# Altium schematic symbol library jlcpcb_2025_04_capacitors_extended_0805.schlib: 3281 symbols (part 8 of 18) (continued)
## CC0805GRNPO0BN221
designator C?  Capacitance: 220pF  (hidden comment: *)
Capacitor, Ceramic (MLCC), 220pF, ±2%, 100V, NP0, ±2%, SMD 0805; Manufacturer: YAGEO; Manufacturer Part Number: CC0805GRNPO0BN221; Package Size: 0805; JLCPCB Basic Part: No; JLCPCB Part Number: C576920; Supplier 1: LCSC; Category: Capacitors - MLCC; Supplier Part Number 1: C576920; Tolerance: ±2%; Voltage Rating: 100V; Temperature Coefficient: NP0; RoHS: Yes; ComponentLink1Description: Datasheet; ComponentLink1URL: https://wmsc.lcsc.com/wmsc/upload/file/pdf/v2/lcsc/2311211121_YAGEO-CC0805GRNPO0BN221_C576920.pdf; ComponentLink2Description: JLCPCB Part URL; ComponentLink2URL: https://jlcpcb.com/partdetail/C576920; ComponentLink3Description: LCSC Part URL; ComponentLink3URL: https://lcsc.com/product-detail/Multilayer-Ceramic-Capacitors-MLCC---SMD-SMT_YAGEO-YAGEO-CC0805GRNPO0BN221_C576920.html
footprint CAP-0805 (0805 (2012M) Capacitor)
pins: 1, 2

## CC0805GRNPO0BN331
designator C?  Capacitance: 330pF  (hidden comment: *)
Capacitor, Ceramic (MLCC), 330pF, ±2%, 100V, NP0, ±2%, SMD 0805; Manufacturer: YAGEO; Manufacturer Part Number: CC0805GRNPO0BN331; Package Size: 0805; JLCPCB Basic Part: No; JLCPCB Part Number: C527193; Supplier 1: LCSC; Category: Capacitors - MLCC; Supplier Part Number 1: C527193; Tolerance: ±2%; Voltage Rating: 100V; Temperature Coefficient: NP0; RoHS: Yes; ComponentLink1Description: Datasheet; ComponentLink1URL: https://wmsc.lcsc.com/wmsc/upload/file/pdf/v2/lcsc/2007021836_YAGEO-CC0805GRNPO0BN331_C527193.pdf; ComponentLink2Description: JLCPCB Part URL; ComponentLink2URL: https://jlcpcb.com/partdetail/C527193; ComponentLink3Description: LCSC Part URL; ComponentLink3URL: https://lcsc.com/product-detail/Multilayer-Ceramic-Capacitors-MLCC---SMD-SMT_YAGEO-YAGEO-CC0805GRNPO0BN331_C527193.html
footprint CAP-0805 (0805 (2012M) Capacitor)
pins: 1, 2

## CC0805GRNPO0BN391
designator C?  Capacitance: 390pF  (hidden comment: *)
Capacitor, Ceramic (MLCC), 390pF, ±2%, 100V, NP0, ±2%, SMD 0805; Manufacturer: YAGEO; Manufacturer Part Number: CC0805GRNPO0BN391; Package Size: 0805; JLCPCB Basic Part: No; JLCPCB Part Number: C1853349; Supplier 1: LCSC; Category: Capacitors - MLCC; Supplier Part Number 1: C1853349; Tolerance: ±2%; Voltage Rating: 100V; Temperature Coefficient: NP0; RoHS: Yes; ComponentLink1Description: Datasheet; ComponentLink1URL: https://wmsc.lcsc.com/wmsc/upload/file/pdf/v2/lcsc/2201271030_YAGEO-CC0805GRNPO0BN391_C1853349.pdf; ComponentLink2Description: JLCPCB Part URL; ComponentLink2URL: https://jlcpcb.com/partdetail/C1853349; ComponentLink3Description: LCSC Part URL; ComponentLink3URL: https://lcsc.com/product-detail/Multilayer-Ceramic-Capacitors-MLCC---SMD-SMT_YAGEO-YAGEO-CC0805GRNPO0BN391_C1853349.html
footprint CAP-0805 (0805 (2012M) Capacitor)
pins: 1, 2

## CC0805GRNPO0BN470
designator C?  Capacitance: 47pF  (hidden comment: *)
Capacitor, Ceramic (MLCC), 47pF, ±2%, 100V, NP0, ±2%, SMD 0805; Manufacturer: YAGEO; Manufacturer Part Number: CC0805GRNPO0BN470; Package Size: 0805; JLCPCB Basic Part: No; JLCPCB Part Number: C527195; Supplier 1: LCSC; Category: Capacitors - MLCC; Supplier Part Number 1: C527195; Tolerance: ±2%; Voltage Rating: 100V; Temperature Coefficient: NP0; RoHS: Yes; ComponentLink1Description: Datasheet; ComponentLink1URL: https://wmsc.lcsc.com/wmsc/upload/file/pdf/v2/lcsc/2007091834_YAGEO-CC0805GRNPO0BN470_C527195.pdf; ComponentLink2Description: JLCPCB Part URL; ComponentLink2URL: https://jlcpcb.com/partdetail/C527195; ComponentLink3Description: LCSC Part URL; ComponentLink3URL: https://lcsc.com/product-detail/Multilayer-Ceramic-Capacitors-MLCC---SMD-SMT_YAGEO-YAGEO-CC0805GRNPO0BN470_C527195.html
footprint CAP-0805 (0805 (2012M) Capacitor)
pins: 1, 2

## CC0805GRNPO0BN471
designator C?  Capacitance: 470pF  (hidden comment: *)
Capacitor, Ceramic (MLCC), 470pF, ±2%, 100V, NP0, ±2%, SMD 0805; Manufacturer: YAGEO; Manufacturer Part Number: CC0805GRNPO0BN471; Package Size: 0805; JLCPCB Basic Part: No; JLCPCB Part Number: C527196; Supplier 1: LCSC; Category: Capacitors - MLCC; Supplier Part Number 1: C527196; Tolerance: ±2%; Voltage Rating: 100V; Temperature Coefficient: NP0; RoHS: Yes; ComponentLink1Description: Datasheet; ComponentLink1URL: https://wmsc.lcsc.com/wmsc/upload/file/pdf/v2/lcsc/2006241834_YAGEO-CC0805GRNPO0BN471_C527196.pdf; ComponentLink2Description: JLCPCB Part URL; ComponentLink2URL: https://jlcpcb.com/partdetail/C527196; ComponentLink3Description: LCSC Part URL; ComponentLink3URL: https://lcsc.com/product-detail/Multilayer-Ceramic-Capacitors-MLCC---SMD-SMT_YAGEO-YAGEO-CC0805GRNPO0BN471_C527196.html
footprint CAP-0805 (0805 (2012M) Capacitor)
pins: 1, 2

## CC0805GRNPO0BN561
designator C?  Capacitance: 560pF  (hidden comment: *)
Capacitor, Ceramic (MLCC), 560pF, ±2%, 100V, NP0, ±2%, SMD 0805; Manufacturer: YAGEO; Manufacturer Part Number: CC0805GRNPO0BN561; Package Size: 0805; JLCPCB Basic Part: No; JLCPCB Part Number: C527197; Supplier 1: LCSC; Category: Capacitors - MLCC; Supplier Part Number 1: C527197; Tolerance: ±2%; Voltage Rating: 100V; Temperature Coefficient: NP0; RoHS: Yes; ComponentLink1Description: Datasheet; ComponentLink1URL: https://wmsc.lcsc.com/wmsc/upload/file/pdf/v2/lcsc/2007021836_YAGEO-CC0805GRNPO0BN561_C527197.pdf; ComponentLink2Description: JLCPCB Part URL; ComponentLink2URL: https://jlcpcb.com/partdetail/C527197; ComponentLink3Description: LCSC Part URL; ComponentLink3URL: https://lcsc.com/product-detail/Multilayer-Ceramic-Capacitors-MLCC---SMD-SMT_YAGEO-YAGEO-CC0805GRNPO0BN561_C527197.html
footprint CAP-0805 (0805 (2012M) Capacitor)
pins: 1, 2

## CC0805GRNPO0BN680
designator C?  Capacitance: 68pF  (hidden comment: *)
Capacitor, Ceramic (MLCC), 68pF, ±2%, 100V, NP0, ±2%, SMD 0805; Manufacturer: YAGEO; Manufacturer Part Number: CC0805GRNPO0BN680; Package Size: 0805; JLCPCB Basic Part: No; JLCPCB Part Number: C576925; Supplier 1: LCSC; Category: Capacitors - MLCC; Supplier Part Number 1: C576925; Tolerance: ±2%; Voltage Rating: 100V; Temperature Coefficient: NP0; RoHS: Yes; ComponentLink1Description: Datasheet; ComponentLink1URL: https://wmsc.lcsc.com/wmsc/upload/file/pdf/v2/lcsc/2311211121_YAGEO-CC0805GRNPO0BN680_C576925.pdf; ComponentLink2Description: JLCPCB Part URL; ComponentLink2URL: https://jlcpcb.com/partdetail/C576925; ComponentLink3Description: LCSC Part URL; ComponentLink3URL: https://lcsc.com/product-detail/Multilayer-Ceramic-Capacitors-MLCC---SMD-SMT_YAGEO-YAGEO-CC0805GRNPO0BN680_C576925.html
footprint CAP-0805 (0805 (2012M) Capacitor)
pins: 1, 2

## CC0805GRNPO0BN681
designator C?  Capacitance: 680pF  (hidden comment: *)
Capacitor, Ceramic (MLCC), 680pF, ±2%, 100V, NP0, ±2%, SMD 0805; Manufacturer: YAGEO; Manufacturer Part Number: CC0805GRNPO0BN681; Package Size: 0805; JLCPCB Basic Part: No; JLCPCB Part Number: C576926; Supplier 1: LCSC; Category: Capacitors - MLCC; Supplier Part Number 1: C576926; Tolerance: ±2%; Voltage Rating: 100V; Temperature Coefficient: NP0; RoHS: Yes; ComponentLink1Description: Datasheet; ComponentLink1URL: https://wmsc.lcsc.com/wmsc/upload/file/pdf/v2/lcsc/2212222108_YAGEO-CC0805GRNPO0BN681_C576926.pdf; ComponentLink2Description: JLCPCB Part URL; ComponentLink2URL: https://jlcpcb.com/partdetail/C576926; ComponentLink3Description: LCSC Part URL; ComponentLink3URL: https://lcsc.com/product-detail/Multilayer-Ceramic-Capacitors-MLCC---SMD-SMT_YAGEO-YAGEO-CC0805GRNPO0BN681_C576926.html
footprint CAP-0805 (0805 (2012M) Capacitor)
pins: 1, 2

## CC0805GRNPO9BN100
designator C?  Capacitance: 10pF  (hidden comment: *)
Capacitor, Ceramic (MLCC), 10pF, ±2%, 50V, NP0, ±2%, SMD 0805; Manufacturer: YAGEO; Manufacturer Part Number: CC0805GRNPO9BN100; Package Size: 0805; JLCPCB Basic Part: No; JLCPCB Part Number: C520053; Supplier 1: LCSC; Category: Capacitors - MLCC; Supplier Part Number 1: C520053; Tolerance: ±2%; Voltage Rating: 50V; Temperature Coefficient: NP0; RoHS: Yes; ComponentLink1Description: Datasheet; ComponentLink1URL: https://wmsc.lcsc.com/wmsc/upload/file/pdf/v2/lcsc/2008051835_YAGEO-CC0805GRNPO9BN100_C520053.pdf; ComponentLink2Description: JLCPCB Part URL; ComponentLink2URL: https://jlcpcb.com/partdetail/C520053; ComponentLink3Description: LCSC Part URL; ComponentLink3URL: https://lcsc.com/product-detail/Multilayer-Ceramic-Capacitors-MLCC---SMD-SMT_YAGEO-YAGEO-CC0805GRNPO9BN100_C520053.html
footprint CAP-0805 (0805 (2012M) Capacitor)
pins: 1, 2

## CC0805GRNPO9BN101
designator C?  Capacitance: 100pF  (hidden comment: *)
Capacitor, Ceramic (MLCC), 100pF, ±2%, 50V, NP0, ±2%, SMD 0805; Manufacturer: YAGEO; Manufacturer Part Number: CC0805GRNPO9BN101; Package Size: 0805; JLCPCB Basic Part: No; JLCPCB Part Number: C520054; Supplier 1: LCSC; Category: Capacitors - MLCC; Supplier Part Number 1: C520054; Tolerance: ±2%; Voltage Rating: 50V; Temperature Coefficient: NP0; RoHS: Yes; ComponentLink1Description: Datasheet; ComponentLink1URL: https://wmsc.lcsc.com/wmsc/upload/file/pdf/v2/lcsc/2008031234_YAGEO-CC0805GRNPO9BN101_C520054.pdf; ComponentLink2Description: JLCPCB Part URL; ComponentLink2URL: https://jlcpcb.com/partdetail/C520054; ComponentLink3Description: LCSC Part URL; ComponentLink3URL: https://lcsc.com/product-detail/Multilayer-Ceramic-Capacitors-MLCC---SMD-SMT_YAGEO-YAGEO-CC0805GRNPO9BN101_C520054.html
footprint CAP-0805 (0805 (2012M) Capacitor)
pins: 1, 2

## CC0805GRNPO9BN102
designator C?  Capacitance: 1nF  (hidden comment: *)
Capacitor, Ceramic (MLCC), 1nF, ±2%, 50V, NP0, ±2%, SMD 0805; Manufacturer: YAGEO; Manufacturer Part Number: CC0805GRNPO9BN102; Package Size: 0805; JLCPCB Basic Part: No; JLCPCB Part Number: C520093; Supplier 1: LCSC; Category: Capacitors - MLCC; Supplier Part Number 1: C520093; Tolerance: ±2%; Voltage Rating: 50V; Temperature Coefficient: NP0; RoHS: Yes; ComponentLink1Description: Datasheet; ComponentLink1URL: https://wmsc.lcsc.com/wmsc/upload/file/pdf/v2/lcsc/2007231535_YAGEO-CC0805GRNPO9BN102_C520093.pdf; ComponentLink2Description: JLCPCB Part URL; ComponentLink2URL: https://jlcpcb.com/partdetail/C520093; ComponentLink3Description: LCSC Part URL; ComponentLink3URL: https://lcsc.com/product-detail/Multilayer-Ceramic-Capacitors-MLCC---SMD-SMT_YAGEO-YAGEO-CC0805GRNPO9BN102_C520093.html
footprint CAP-0805 (0805 (2012M) Capacitor)
pins: 1, 2

## CC0805GRNPO9BN120
designator C?  Capacitance: 12pF  (hidden comment: *)
Capacitor, Ceramic (MLCC), 12pF, ±2%, 50V, NP0, ±2%, SMD 0805; Manufacturer: YAGEO; Manufacturer Part Number: CC0805GRNPO9BN120; Package Size: 0805; JLCPCB Basic Part: No; JLCPCB Part Number: C520055; Supplier 1: LCSC; Category: Capacitors - MLCC; Supplier Part Number 1: C520055; Tolerance: ±2%; Voltage Rating: 50V; Temperature Coefficient: NP0; RoHS: Yes; ComponentLink1Description: Datasheet; ComponentLink1URL: https://wmsc.lcsc.com/wmsc/upload/file/pdf/v2/lcsc/2007231535_YAGEO-CC0805GRNPO9BN120_C520055.pdf; ComponentLink2Description: JLCPCB Part URL; ComponentLink2URL: https://jlcpcb.com/partdetail/C520055; ComponentLink3Description: LCSC Part URL; ComponentLink3URL: https://lcsc.com/product-detail/Multilayer-Ceramic-Capacitors-MLCC---SMD-SMT_YAGEO-YAGEO-CC0805GRNPO9BN120_C520055.html
footprint CAP-0805 (0805 (2012M) Capacitor)
pins: 1, 2

## CC0805GRNPO9BN121
designator C?  Capacitance: 120pF  (hidden comment: *)
Capacitor, Ceramic (MLCC), 120pF, ±2%, 50V, NP0, ±2%, SMD 0805; Manufacturer: YAGEO; Manufacturer Part Number: CC0805GRNPO9BN121; Package Size: 0805; JLCPCB Basic Part: No; JLCPCB Part Number: C309483; Supplier 1: LCSC; Category: Capacitors - MLCC; Supplier Part Number 1: C309483; Tolerance: ±2%; Voltage Rating: 50V; Temperature Coefficient: NP0; RoHS: Yes; ComponentLink1Description: Datasheet; ComponentLink1URL: https://wmsc.lcsc.com/wmsc/upload/file/pdf/v2/lcsc/2304140030_YAGEO-CC0805GRNPO9BN121_C309483.pdf; ComponentLink2Description: JLCPCB Part URL; ComponentLink2URL: https://jlcpcb.com/partdetail/C309483; ComponentLink3Description: LCSC Part URL; ComponentLink3URL: https://lcsc.com/product-detail/Multilayer-Ceramic-Capacitors-MLCC---SMD-SMT_YAGEO-YAGEO-CC0805GRNPO9BN121_C309483.html
footprint CAP-0805 (0805 (2012M) Capacitor)
pins: 1, 2

## CC0805GRNPO9BN122
designator C?  Capacitance: 1.2nF  (hidden comment: *)
Capacitor, Ceramic (MLCC), 1.2nF, ±2%, 50V, NP0, ±2%, SMD 0805; Manufacturer: YAGEO; Manufacturer Part Number: CC0805GRNPO9BN122; Package Size: 0805; JLCPCB Basic Part: No; JLCPCB Part Number: C541552; Supplier 1: LCSC; Category: Capacitors - MLCC; Supplier Part Number 1: C541552; Tolerance: ±2%; Voltage Rating: 50V; Temperature Coefficient: NP0; RoHS: Yes; ComponentLink1Description: Datasheet; ComponentLink1URL: https://wmsc.lcsc.com/wmsc/upload/file/pdf/v2/lcsc/2006151144_YAGEO-CC0805GRNPO9BN122_C541552.pdf; ComponentLink2Description: JLCPCB Part URL; ComponentLink2URL: https://jlcpcb.com/partdetail/C541552; ComponentLink3Description: LCSC Part URL; ComponentLink3URL: https://lcsc.com/product-detail/Multilayer-Ceramic-Capacitors-MLCC---SMD-SMT_YAGEO-YAGEO-CC0805GRNPO9BN122_C541552.html
footprint CAP-0805 (0805 (2012M) Capacitor)
pins: 1, 2

## CC0805GRNPO9BN150
designator C?  Capacitance: 15pF  (hidden comment: *)
Capacitor, Ceramic (MLCC), 15pF, ±2%, 50V, NP0, ±2%, SMD 0805; Manufacturer: YAGEO; Manufacturer Part Number: CC0805GRNPO9BN150; Package Size: 0805; JLCPCB Basic Part: No; JLCPCB Part Number: C520056; Supplier 1: LCSC; Category: Capacitors - MLCC; Supplier Part Number 1: C520056; Tolerance: ±2%; Voltage Rating: 50V; Temperature Coefficient: NP0; RoHS: Yes; ComponentLink1Description: Datasheet; ComponentLink1URL: https://wmsc.lcsc.com/wmsc/upload/file/pdf/v2/lcsc/2008191833_YAGEO-CC0805GRNPO9BN150_C520056.pdf; ComponentLink2Description: JLCPCB Part URL; ComponentLink2URL: https://jlcpcb.com/partdetail/C520056; ComponentLink3Description: LCSC Part URL; ComponentLink3URL: https://lcsc.com/product-detail/Multilayer-Ceramic-Capacitors-MLCC---SMD-SMT_YAGEO-YAGEO-CC0805GRNPO9BN150_C520056.html
footprint CAP-0805 (0805 (2012M) Capacitor)
pins: 1, 2

## CC0805GRNPO9BN151
designator C?  Capacitance: 150pF  (hidden comment: *)
Capacitor, Ceramic (MLCC), 150pF, ±2%, 50V, NP0, ±2%, SMD 0805; Manufacturer: YAGEO; Manufacturer Part Number: CC0805GRNPO9BN151; Package Size: 0805; JLCPCB Basic Part: No; JLCPCB Part Number: C520084; Supplier 1: LCSC; Category: Capacitors - MLCC; Supplier Part Number 1: C520084; Tolerance: ±2%; Voltage Rating: 50V; Temperature Coefficient: NP0; RoHS: Yes; ComponentLink1Description: Datasheet; ComponentLink1URL: https://wmsc.lcsc.com/wmsc/upload/file/pdf/v2/lcsc/2006011837_YAGEO-CC0805GRNPO9BN151_C520084.pdf; ComponentLink2Description: JLCPCB Part URL; ComponentLink2URL: https://jlcpcb.com/partdetail/C520084; ComponentLink3Description: LCSC Part URL; ComponentLink3URL: https://lcsc.com/product-detail/Multilayer-Ceramic-Capacitors-MLCC---SMD-SMT_YAGEO-YAGEO-CC0805GRNPO9BN151_C520084.html
footprint CAP-0805 (0805 (2012M) Capacitor)
pins: 1, 2

## CC0805GRNPO9BN152
designator C?  Capacitance: 1.5nF  (hidden comment: *)
Capacitor, Ceramic (MLCC), 1.5nF, ±2%, 50V, NP0, ±2%, SMD 0805; Manufacturer: YAGEO; Manufacturer Part Number: CC0805GRNPO9BN152; Package Size: 0805; JLCPCB Basic Part: No; JLCPCB Part Number: C541553; Supplier 1: LCSC; Category: Capacitors - MLCC; Supplier Part Number 1: C541553; Tolerance: ±2%; Voltage Rating: 50V; Temperature Coefficient: NP0; RoHS: Yes; ComponentLink1Description: Datasheet; ComponentLink1URL: https://wmsc.lcsc.com/wmsc/upload/file/pdf/v2/lcsc/2006151145_YAGEO-CC0805GRNPO9BN152_C541553.pdf; ComponentLink2Description: JLCPCB Part URL; ComponentLink2URL: https://jlcpcb.com/partdetail/C541553; ComponentLink3Description: LCSC Part URL; ComponentLink3URL: https://lcsc.com/product-detail/Multilayer-Ceramic-Capacitors-MLCC---SMD-SMT_YAGEO-YAGEO-CC0805GRNPO9BN152_C541553.html
footprint CAP-0805 (0805 (2012M) Capacitor)
pins: 1, 2

## CC0805GRNPO9BN180
designator C?  Capacitance: 18pF  (hidden comment: *)
Capacitor, Ceramic (MLCC), 18pF, ±2%, 50V, NP0, ±2%, SMD 0805; Manufacturer: YAGEO; Manufacturer Part Number: CC0805GRNPO9BN180; Package Size: 0805; JLCPCB Basic Part: No; JLCPCB Part Number: C520057; Supplier 1: LCSC; Category: Capacitors - MLCC; Supplier Part Number 1: C520057; Tolerance: ±2%; Voltage Rating: 50V; Temperature Coefficient: NP0; RoHS: Yes; ComponentLink1Description: Datasheet; ComponentLink1URL: https://wmsc.lcsc.com/wmsc/upload/file/pdf/v2/lcsc/2007231535_YAGEO-CC0805GRNPO9BN180_C520057.pdf; ComponentLink2Description: JLCPCB Part URL; ComponentLink2URL: https://jlcpcb.com/partdetail/C520057; ComponentLink3Description: LCSC Part URL; ComponentLink3URL: https://lcsc.com/product-detail/Multilayer-Ceramic-Capacitors-MLCC---SMD-SMT_YAGEO-YAGEO-CC0805GRNPO9BN180_C520057.html
footprint CAP-0805 (0805 (2012M) Capacitor)
pins: 1, 2

## CC0805GRNPO9BN181
designator C?  Capacitance: 180pF  (hidden comment: *)
Capacitor, Ceramic (MLCC), 180pF, ±2%, 50V, NP0, ±2%, SMD 0805; Manufacturer: YAGEO; Manufacturer Part Number: CC0805GRNPO9BN181; Package Size: 0805; JLCPCB Basic Part: No; JLCPCB Part Number: C520085; Supplier 1: LCSC; Category: Capacitors - MLCC; Supplier Part Number 1: C520085; Tolerance: ±2%; Voltage Rating: 50V; Temperature Coefficient: NP0; RoHS: Yes; ComponentLink1Description: Datasheet; ComponentLink1URL: https://wmsc.lcsc.com/wmsc/upload/file/pdf/v2/lcsc/2006011837_YAGEO-CC0805GRNPO9BN181_C520085.pdf; ComponentLink2Description: JLCPCB Part URL; ComponentLink2URL: https://jlcpcb.com/partdetail/C520085; ComponentLink3Description: LCSC Part URL; ComponentLink3URL: https://lcsc.com/product-detail/Multilayer-Ceramic-Capacitors-MLCC---SMD-SMT_YAGEO-YAGEO-CC0805GRNPO9BN181_C520085.html
footprint CAP-0805 (0805 (2012M) Capacitor)
pins: 1, 2

## CC0805GRNPO9BN182
designator C?  Capacitance: 1.8nF  (hidden comment: *)
Capacitor, Ceramic (MLCC), 1.8nF, ±2%, 50V, NP0, ±2%, SMD 0805; Manufacturer: YAGEO; Manufacturer Part Number: CC0805GRNPO9BN182; Package Size: 0805; JLCPCB Basic Part: No; JLCPCB Part Number: C541554; Supplier 1: LCSC; Category: Capacitors - MLCC; Supplier Part Number 1: C541554; Tolerance: ±2%; Voltage Rating: 50V; Temperature Coefficient: NP0; RoHS: Yes; ComponentLink1Description: Datasheet; ComponentLink1URL: https://wmsc.lcsc.com/wmsc/upload/file/pdf/v2/lcsc/2006151145_YAGEO-CC0805GRNPO9BN182_C541554.pdf; ComponentLink2Description: JLCPCB Part URL; ComponentLink2URL: https://jlcpcb.com/partdetail/C541554; ComponentLink3Description: LCSC Part URL; ComponentLink3URL: https://lcsc.com/product-detail/Multilayer-Ceramic-Capacitors-MLCC---SMD-SMT_YAGEO-YAGEO-CC0805GRNPO9BN182_C541554.html
footprint CAP-0805 (0805 (2012M) Capacitor)
pins: 1, 2

## CC0805GRNPO9BN200
designator C?  Capacitance: 20pF  (hidden comment: *)
Capacitor, Ceramic (MLCC), 20pF, ±2%, 50V, NP0, ±2%, SMD 0805; Manufacturer: YAGEO; Manufacturer Part Number: CC0805GRNPO9BN200; Package Size: 0805; JLCPCB Basic Part: No; JLCPCB Part Number: C520066; Supplier 1: LCSC; Category: Capacitors - MLCC; Supplier Part Number 1: C520066; Tolerance: ±2%; Voltage Rating: 50V; Temperature Coefficient: NP0; RoHS: Yes; ComponentLink1Description: Datasheet; ComponentLink1URL: https://wmsc.lcsc.com/wmsc/upload/file/pdf/v2/lcsc/2007161235_YAGEO-CC0805GRNPO9BN200_C520066.pdf; ComponentLink2Description: JLCPCB Part URL; ComponentLink2URL: https://jlcpcb.com/partdetail/C520066; ComponentLink3Description: LCSC Part URL; ComponentLink3URL: https://lcsc.com/product-detail/Multilayer-Ceramic-Capacitors-MLCC---SMD-SMT_YAGEO-YAGEO-CC0805GRNPO9BN200_C520066.html
footprint CAP-0805 (0805 (2012M) Capacitor)
pins: 1, 2

## CC0805GRNPO9BN201
designator C?  Capacitance: 200pF  (hidden comment: *)
Capacitor, Ceramic (MLCC), 200pF, ±2%, 50V, NP0, ±2%, SMD 0805; Manufacturer: YAGEO; Manufacturer Part Number: CC0805GRNPO9BN201; Package Size: 0805; JLCPCB Basic Part: No; JLCPCB Part Number: C541504; Supplier 1: LCSC; Category: Capacitors - MLCC; Supplier Part Number 1: C541504; Tolerance: ±2%; Voltage Rating: 50V; Temperature Coefficient: NP0; RoHS: Yes; ComponentLink1Description: Datasheet; ComponentLink1URL: https://wmsc.lcsc.com/wmsc/upload/file/pdf/v2/lcsc/2006151141_YAGEO-CC0805GRNPO9BN201_C541504.pdf; ComponentLink2Description: JLCPCB Part URL; ComponentLink2URL: https://jlcpcb.com/partdetail/C541504; ComponentLink3Description: LCSC Part URL; ComponentLink3URL: https://lcsc.com/product-detail/Multilayer-Ceramic-Capacitors-MLCC---SMD-SMT_YAGEO-YAGEO-CC0805GRNPO9BN201_C541504.html
footprint CAP-0805 (0805 (2012M) Capacitor)
pins: 1, 2

## CC0805GRNPO9BN220
designator C?  Capacitance: 22pF  (hidden comment: *)
Capacitor, Ceramic (MLCC), 22pF, ±2%, 50V, NP0, ±2%, SMD 0805; Manufacturer: YAGEO; Manufacturer Part Number: CC0805GRNPO9BN220; Package Size: 0805; JLCPCB Basic Part: No; JLCPCB Part Number: C520058; Supplier 1: LCSC; Category: Capacitors - MLCC; Supplier Part Number 1: C520058; Tolerance: ±2%; Voltage Rating: 50V; Temperature Coefficient: NP0; RoHS: Yes; ComponentLink1Description: Datasheet; ComponentLink1URL: https://wmsc.lcsc.com/wmsc/upload/file/pdf/v2/lcsc/2006011836_YAGEO-CC0805GRNPO9BN220_C520058.pdf; ComponentLink2Description: JLCPCB Part URL; ComponentLink2URL: https://jlcpcb.com/partdetail/C520058; ComponentLink3Description: LCSC Part URL; ComponentLink3URL: https://lcsc.com/product-detail/Multilayer-Ceramic-Capacitors-MLCC---SMD-SMT_YAGEO-YAGEO-CC0805GRNPO9BN220_C520058.html
footprint CAP-0805 (0805 (2012M) Capacitor)
pins: 1, 2

## CC0805GRNPO9BN221
designator C?  Capacitance: 220pF  (hidden comment: *)
Capacitor, Ceramic (MLCC), 220pF, ±2%, 50V, NP0, ±2%, SMD 0805; Manufacturer: YAGEO; Manufacturer Part Number: CC0805GRNPO9BN221; Package Size: 0805; JLCPCB Basic Part: No; JLCPCB Part Number: C520086; Supplier 1: LCSC; Category: Capacitors - MLCC; Supplier Part Number 1: C520086; Tolerance: ±2%; Voltage Rating: 50V; Temperature Coefficient: NP0; RoHS: Yes; ComponentLink1Description: Datasheet; ComponentLink1URL: https://wmsc.lcsc.com/wmsc/upload/file/pdf/v2/lcsc/2005141204_YAGEO-CC0805GRNPO9BN221_C520086.pdf; ComponentLink2Description: JLCPCB Part URL; ComponentLink2URL: https://jlcpcb.com/partdetail/C520086; ComponentLink3Description: LCSC Part URL; ComponentLink3URL: https://lcsc.com/product-detail/Multilayer-Ceramic-Capacitors-MLCC---SMD-SMT_YAGEO-YAGEO-CC0805GRNPO9BN221_C520086.html
footprint CAP-0805 (0805 (2012M) Capacitor)
pins: 1, 2

## CC0805GRNPO9BN270
designator C?  Capacitance: 27pF  (hidden comment: *)
Capacitor, Ceramic (MLCC), 27pF, ±2%, 50V, NP0, ±2%, SMD 0805; Manufacturer: YAGEO; Manufacturer Part Number: CC0805GRNPO9BN270; Package Size: 0805; JLCPCB Basic Part: No; JLCPCB Part Number: C520059; Supplier 1: LCSC; Category: Capacitors - MLCC; Supplier Part Number 1: C520059; Tolerance: ±2%; Voltage Rating: 50V; Temperature Coefficient: NP0; RoHS: Yes; ComponentLink1Description: Datasheet; ComponentLink1URL: https://wmsc.lcsc.com/wmsc/upload/file/pdf/v2/lcsc/2006011836_YAGEO-CC0805GRNPO9BN270_C520059.pdf; ComponentLink2Description: JLCPCB Part URL; ComponentLink2URL: https://jlcpcb.com/partdetail/C520059; ComponentLink3Description: LCSC Part URL; ComponentLink3URL: https://lcsc.com/product-detail/Multilayer-Ceramic-Capacitors-MLCC---SMD-SMT_YAGEO-YAGEO-CC0805GRNPO9BN270_C520059.html
footprint CAP-0805 (0805 (2012M) Capacitor)
pins: 1, 2

## CC0805GRNPO9BN271
designator C?  Capacitance: 270pF  (hidden comment: *)
Capacitor, Ceramic (MLCC), 270pF, ±2%, 50V, NP0, ±2%, SMD 0805; Manufacturer: YAGEO; Manufacturer Part Number: CC0805GRNPO9BN271; Package Size: 0805; JLCPCB Basic Part: No; JLCPCB Part Number: C520087; Supplier 1: LCSC; Category: Capacitors - MLCC; Supplier Part Number 1: C520087; Tolerance: ±2%; Voltage Rating: 50V; Temperature Coefficient: NP0; RoHS: Yes; ComponentLink1Description: Datasheet; ComponentLink1URL: https://wmsc.lcsc.com/wmsc/upload/file/pdf/v2/lcsc/2006011837_YAGEO-CC0805GRNPO9BN271_C520087.pdf; ComponentLink2Description: JLCPCB Part URL; ComponentLink2URL: https://jlcpcb.com/partdetail/C520087; ComponentLink3Description: LCSC Part URL; ComponentLink3URL: https://lcsc.com/product-detail/Multilayer-Ceramic-Capacitors-MLCC---SMD-SMT_YAGEO-YAGEO-CC0805GRNPO9BN271_C520087.html
footprint CAP-0805 (0805 (2012M) Capacitor)
pins: 1, 2

## CC0805GRNPO9BN300
designator C?  Capacitance: 30pF  (hidden comment: *)
Capacitor, Ceramic (MLCC), 30pF, ±2%, 50V, NP0, ±2%, SMD 0805; Manufacturer: YAGEO; Manufacturer Part Number: CC0805GRNPO9BN300; Package Size: 0805; JLCPCB Basic Part: No; JLCPCB Part Number: C520067; Supplier 1: LCSC; Category: Capacitors - MLCC; Supplier Part Number 1: C520067; Tolerance: ±2%; Voltage Rating: 50V; Temperature Coefficient: NP0; RoHS: Yes; ComponentLink1Description: Datasheet; ComponentLink1URL: https://wmsc.lcsc.com/wmsc/upload/file/pdf/v2/lcsc/2012162139_YAGEO-CC0805GRNPO9BN300_C520067.pdf; ComponentLink2Description: JLCPCB Part URL; ComponentLink2URL: https://jlcpcb.com/partdetail/C520067; ComponentLink3Description: LCSC Part URL; ComponentLink3URL: https://lcsc.com/product-detail/Multilayer-Ceramic-Capacitors-MLCC---SMD-SMT_YAGEO-YAGEO-CC0805GRNPO9BN300_C520067.html
footprint CAP-0805 (0805 (2012M) Capacitor)
pins: 1, 2

## CC0805GRNPO9BN330
designator C?  Capacitance: 33pF  (hidden comment: *)
Capacitor, Ceramic (MLCC), 33pF, ±2%, 50V, NP0, ±2%, SMD 0805; Manufacturer: YAGEO; Manufacturer Part Number: CC0805GRNPO9BN330; Package Size: 0805; JLCPCB Basic Part: No; JLCPCB Part Number: C520060; Supplier 1: LCSC; Category: Capacitors - MLCC; Supplier Part Number 1: C520060; Tolerance: ±2%; Voltage Rating: 50V; Temperature Coefficient: NP0; RoHS: Yes; ComponentLink1Description: Datasheet; ComponentLink1URL: https://wmsc.lcsc.com/wmsc/upload/file/pdf/v2/lcsc/2005141204_YAGEO-CC0805GRNPO9BN330_C520060.pdf; ComponentLink2Description: JLCPCB Part URL; ComponentLink2URL: https://jlcpcb.com/partdetail/C520060; ComponentLink3Description: LCSC Part URL; ComponentLink3URL: https://lcsc.com/product-detail/Multilayer-Ceramic-Capacitors-MLCC---SMD-SMT_YAGEO-YAGEO-CC0805GRNPO9BN330_C520060.html
footprint CAP-0805 (0805 (2012M) Capacitor)
pins: 1, 2

## CC0805GRNPO9BN331
designator C?  Capacitance: 330pF  (hidden comment: *)
Capacitor, Ceramic (MLCC), 330pF, ±2%, 50V, NP0, ±2%, SMD 0805; Manufacturer: YAGEO; Manufacturer Part Number: CC0805GRNPO9BN331; Package Size: 0805; JLCPCB Basic Part: No; JLCPCB Part Number: C520088; Supplier 1: LCSC; Category: Capacitors - MLCC; Supplier Part Number 1: C520088; Tolerance: ±2%; Voltage Rating: 50V; Temperature Coefficient: NP0; RoHS: Yes; ComponentLink1Description: Datasheet; ComponentLink1URL: https://wmsc.lcsc.com/wmsc/upload/file/pdf/v2/lcsc/2005181836_YAGEO-CC0805GRNPO9BN331_C520088.pdf; ComponentLink2Description: JLCPCB Part URL; ComponentLink2URL: https://jlcpcb.com/partdetail/C520088; ComponentLink3Description: LCSC Part URL; ComponentLink3URL: https://lcsc.com/product-detail/Multilayer-Ceramic-Capacitors-MLCC---SMD-SMT_YAGEO-YAGEO-CC0805GRNPO9BN331_C520088.html
footprint CAP-0805 (0805 (2012M) Capacitor)
pins: 1, 2

## CC0805GRNPO9BN390
designator C?  Capacitance: 39pF  (hidden comment: *)
Capacitor, Ceramic (MLCC), 39pF, ±2%, 50V, NP0, ±2%, SMD 0805; Manufacturer: YAGEO; Manufacturer Part Number: CC0805GRNPO9BN390; Package Size: 0805; JLCPCB Basic Part: No; JLCPCB Part Number: C520061; Supplier 1: LCSC; Category: Capacitors - MLCC; Supplier Part Number 1: C520061; Tolerance: ±2%; Voltage Rating: 50V; Temperature Coefficient: NP0; RoHS: Yes; ComponentLink1Description: Datasheet; ComponentLink1URL: https://wmsc.lcsc.com/wmsc/upload/file/pdf/v2/lcsc/2008051835_YAGEO-CC0805GRNPO9BN390_C520061.pdf; ComponentLink2Description: JLCPCB Part URL; ComponentLink2URL: https://jlcpcb.com/partdetail/C520061; ComponentLink3Description: LCSC Part URL; ComponentLink3URL: https://lcsc.com/product-detail/Multilayer-Ceramic-Capacitors-MLCC---SMD-SMT_YAGEO-YAGEO-CC0805GRNPO9BN390_C520061.html
footprint CAP-0805 (0805 (2012M) Capacitor)
pins: 1, 2

## CC0805GRNPO9BN391
designator C?  Capacitance: 390pF  (hidden comment: *)
Capacitor, Ceramic (MLCC), 390pF, ±2%, 50V, NP0, ±2%, SMD 0805; Manufacturer: YAGEO; Manufacturer Part Number: CC0805GRNPO9BN391; Package Size: 0805; JLCPCB Basic Part: No; JLCPCB Part Number: C520089; Supplier 1: LCSC; Category: Capacitors - MLCC; Supplier Part Number 1: C520089; Tolerance: ±2%; Voltage Rating: 50V; Temperature Coefficient: NP0; RoHS: Yes; ComponentLink1Description: Datasheet; ComponentLink1URL: https://wmsc.lcsc.com/wmsc/upload/file/pdf/v2/lcsc/2007231535_YAGEO-CC0805GRNPO9BN391_C520089.pdf; ComponentLink2Description: JLCPCB Part URL; ComponentLink2URL: https://jlcpcb.com/partdetail/C520089; ComponentLink3Description: LCSC Part URL; ComponentLink3URL: https://lcsc.com/product-detail/Multilayer-Ceramic-Capacitors-MLCC---SMD-SMT_YAGEO-YAGEO-CC0805GRNPO9BN391_C520089.html
footprint CAP-0805 (0805 (2012M) Capacitor)
pins: 1, 2

## CC0805GRNPO9BN470
designator C?  Capacitance: 47pF  (hidden comment: *)
Capacitor, Ceramic (MLCC), 47pF, ±2%, 50V, NP0, ±2%, SMD 0805; Manufacturer: YAGEO; Manufacturer Part Number: CC0805GRNPO9BN470; Package Size: 0805; JLCPCB Basic Part: No; JLCPCB Part Number: C520062; Supplier 1: LCSC; Category: Capacitors - MLCC; Supplier Part Number 1: C520062; Tolerance: ±2%; Voltage Rating: 50V; Temperature Coefficient: NP0; RoHS: Yes; ComponentLink1Description: Datasheet; ComponentLink1URL: https://wmsc.lcsc.com/wmsc/upload/file/pdf/v2/lcsc/2006011836_YAGEO-CC0805GRNPO9BN470_C520062.pdf; ComponentLink2Description: JLCPCB Part URL; ComponentLink2URL: https://jlcpcb.com/partdetail/C520062; ComponentLink3Description: LCSC Part URL; ComponentLink3URL: https://lcsc.com/product-detail/Multilayer-Ceramic-Capacitors-MLCC---SMD-SMT_YAGEO-YAGEO-CC0805GRNPO9BN470_C520062.html
footprint CAP-0805 (0805 (2012M) Capacitor)
pins: 1, 2

## CC0805GRNPO9BN471
designator C?  Capacitance: 470pF  (hidden comment: *)
Capacitor, Ceramic (MLCC), 470pF, ±2%, 50V, NP0, ±2%, SMD 0805; Manufacturer: YAGEO; Manufacturer Part Number: CC0805GRNPO9BN471; Package Size: 0805; JLCPCB Basic Part: No; JLCPCB Part Number: C520090; Supplier 1: LCSC; Category: Capacitors - MLCC; Supplier Part Number 1: C520090; Tolerance: ±2%; Voltage Rating: 50V; Temperature Coefficient: NP0; RoHS: Yes; ComponentLink1Description: Datasheet; ComponentLink1URL: https://wmsc.lcsc.com/wmsc/upload/file/pdf/v2/lcsc/2005141204_YAGEO-CC0805GRNPO9BN471_C520090.pdf; ComponentLink2Description: JLCPCB Part URL; ComponentLink2URL: https://jlcpcb.com/partdetail/C520090; ComponentLink3Description: LCSC Part URL; ComponentLink3URL: https://lcsc.com/product-detail/Multilayer-Ceramic-Capacitors-MLCC---SMD-SMT_YAGEO-YAGEO-CC0805GRNPO9BN471_C520090.html
footprint CAP-0805 (0805 (2012M) Capacitor)
pins: 1, 2

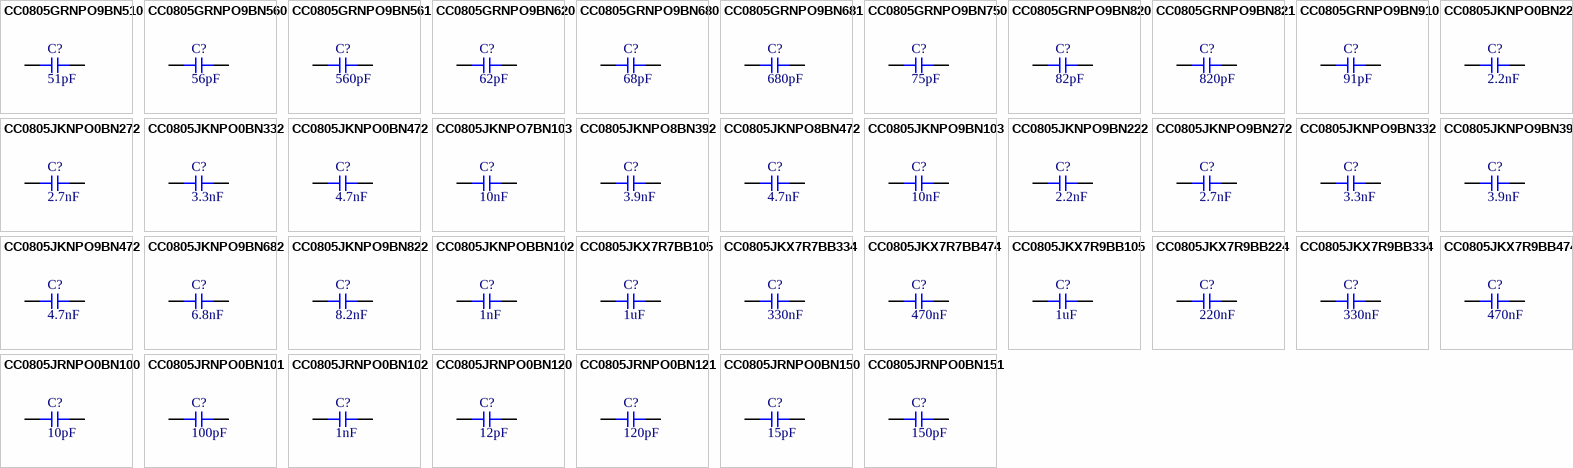
[diagram p34: symbols CC0805GRNPO9BN510 to CC0805JRNPO0BN151]

## CC0805GRNPO9BN510
designator C?  Capacitance: 51pF  (hidden comment: *)
Capacitor, Ceramic (MLCC), 51pF, ±2%, 50V, NP0, ±2%, SMD 0805; Manufacturer: YAGEO; Manufacturer Part Number: CC0805GRNPO9BN510; Package Size: 0805; JLCPCB Basic Part: No; JLCPCB Part Number: C520068; Supplier 1: LCSC; Category: Capacitors - MLCC; Supplier Part Number 1: C520068; Tolerance: ±2%; Voltage Rating: 50V; Temperature Coefficient: NP0; RoHS: Yes; ComponentLink1Description: Datasheet; ComponentLink1URL: https://wmsc.lcsc.com/wmsc/upload/file/pdf/v2/lcsc/2007231535_YAGEO-CC0805GRNPO9BN510_C520068.pdf; ComponentLink2Description: JLCPCB Part URL; ComponentLink2URL: https://jlcpcb.com/partdetail/C520068; ComponentLink3Description: LCSC Part URL; ComponentLink3URL: https://lcsc.com/product-detail/Multilayer-Ceramic-Capacitors-MLCC---SMD-SMT_YAGEO-YAGEO-CC0805GRNPO9BN510_C520068.html
footprint CAP-0805 (0805 (2012M) Capacitor)
pins: 1, 2

## CC0805GRNPO9BN560
designator C?  Capacitance: 56pF  (hidden comment: *)
Capacitor, Ceramic (MLCC), 56pF, ±2%, 50V, NP0, ±2%, SMD 0805; Manufacturer: YAGEO; Manufacturer Part Number: CC0805GRNPO9BN560; Package Size: 0805; JLCPCB Basic Part: No; JLCPCB Part Number: C520063; Supplier 1: LCSC; Category: Capacitors - MLCC; Supplier Part Number 1: C520063; Tolerance: ±2%; Voltage Rating: 50V; Temperature Coefficient: NP0; RoHS: Yes; ComponentLink1Description: Datasheet; ComponentLink1URL: https://wmsc.lcsc.com/wmsc/upload/file/pdf/v2/lcsc/2008051835_YAGEO-CC0805GRNPO9BN560_C520063.pdf; ComponentLink2Description: JLCPCB Part URL; ComponentLink2URL: https://jlcpcb.com/partdetail/C520063; ComponentLink3Description: LCSC Part URL; ComponentLink3URL: https://lcsc.com/product-detail/Multilayer-Ceramic-Capacitors-MLCC---SMD-SMT_YAGEO-YAGEO-CC0805GRNPO9BN560_C520063.html
footprint CAP-0805 (0805 (2012M) Capacitor)
pins: 1, 2

## CC0805GRNPO9BN561
designator C?  Capacitance: 560pF  (hidden comment: *)
Capacitor, Ceramic (MLCC), 560pF, ±2%, 50V, NP0, ±2%, SMD 0805; Manufacturer: YAGEO; Manufacturer Part Number: CC0805GRNPO9BN561; Package Size: 0805; JLCPCB Basic Part: No; JLCPCB Part Number: C520091; Supplier 1: LCSC; Category: Capacitors - MLCC; Supplier Part Number 1: C520091; Tolerance: ±2%; Voltage Rating: 50V; Temperature Coefficient: NP0; RoHS: Yes; ComponentLink1Description: Datasheet; ComponentLink1URL: https://wmsc.lcsc.com/wmsc/upload/file/pdf/v2/lcsc/2006011837_YAGEO-CC0805GRNPO9BN561_C520091.pdf; ComponentLink2Description: JLCPCB Part URL; ComponentLink2URL: https://jlcpcb.com/partdetail/C520091; ComponentLink3Description: LCSC Part URL; ComponentLink3URL: https://lcsc.com/product-detail/Multilayer-Ceramic-Capacitors-MLCC---SMD-SMT_YAGEO-YAGEO-CC0805GRNPO9BN561_C520091.html
footprint CAP-0805 (0805 (2012M) Capacitor)
pins: 1, 2

## CC0805GRNPO9BN620
designator C?  Capacitance: 62pF  (hidden comment: *)
Capacitor, Ceramic (MLCC), 62pF, ±2%, 50V, NP0, ±2%, SMD 0805; Manufacturer: YAGEO; Manufacturer Part Number: CC0805GRNPO9BN620; Package Size: 0805; JLCPCB Basic Part: No; JLCPCB Part Number: C520069; Supplier 1: LCSC; Category: Capacitors - MLCC; Supplier Part Number 1: C520069; Tolerance: ±2%; Voltage Rating: 50V; Temperature Coefficient: NP0; RoHS: Yes; ComponentLink1Description: Datasheet; ComponentLink1URL: https://wmsc.lcsc.com/wmsc/upload/file/pdf/v2/lcsc/2009041635_YAGEO-CC0805GRNPO9BN620_C520069.pdf; ComponentLink2Description: JLCPCB Part URL; ComponentLink2URL: https://jlcpcb.com/partdetail/C520069; ComponentLink3Description: LCSC Part URL; ComponentLink3URL: https://lcsc.com/product-detail/Multilayer-Ceramic-Capacitors-MLCC---SMD-SMT_YAGEO-YAGEO-CC0805GRNPO9BN620_C520069.html
footprint CAP-0805 (0805 (2012M) Capacitor)
pins: 1, 2

## CC0805GRNPO9BN680
designator C?  Capacitance: 68pF  (hidden comment: *)
Capacitor, Ceramic (MLCC), 68pF, ±2%, 50V, NP0, ±2%, SMD 0805; Manufacturer: YAGEO; Manufacturer Part Number: CC0805GRNPO9BN680; Package Size: 0805; JLCPCB Basic Part: No; JLCPCB Part Number: C520064; Supplier 1: LCSC; Category: Capacitors - MLCC; Supplier Part Number 1: C520064; Tolerance: ±2%; Voltage Rating: 50V; Temperature Coefficient: NP0; RoHS: Yes; ComponentLink1Description: Datasheet; ComponentLink1URL: https://wmsc.lcsc.com/wmsc/upload/file/pdf/v2/lcsc/2007231535_YAGEO-CC0805GRNPO9BN680_C520064.pdf; ComponentLink2Description: JLCPCB Part URL; ComponentLink2URL: https://jlcpcb.com/partdetail/C520064; ComponentLink3Description: LCSC Part URL; ComponentLink3URL: https://lcsc.com/product-detail/Multilayer-Ceramic-Capacitors-MLCC---SMD-SMT_YAGEO-YAGEO-CC0805GRNPO9BN680_C520064.html
footprint CAP-0805 (0805 (2012M) Capacitor)
pins: 1, 2

## CC0805GRNPO9BN681
designator C?  Capacitance: 680pF  (hidden comment: *)
Capacitor, Ceramic (MLCC), 680pF, ±2%, 50V, NP0, ±2%, SMD 0805; Manufacturer: YAGEO; Manufacturer Part Number: CC0805GRNPO9BN681; Package Size: 0805; JLCPCB Basic Part: No; JLCPCB Part Number: C520092; Supplier 1: LCSC; Category: Capacitors - MLCC; Supplier Part Number 1: C520092; Tolerance: ±2%; Voltage Rating: 50V; Temperature Coefficient: NP0; RoHS: Yes; ComponentLink1Description: Datasheet; ComponentLink1URL: https://wmsc.lcsc.com/wmsc/upload/file/pdf/v2/lcsc/2005181836_YAGEO-CC0805GRNPO9BN681_C520092.pdf; ComponentLink2Description: JLCPCB Part URL; ComponentLink2URL: https://jlcpcb.com/partdetail/C520092; ComponentLink3Description: LCSC Part URL; ComponentLink3URL: https://lcsc.com/product-detail/Multilayer-Ceramic-Capacitors-MLCC---SMD-SMT_YAGEO-YAGEO-CC0805GRNPO9BN681_C520092.html
footprint CAP-0805 (0805 (2012M) Capacitor)
pins: 1, 2

## CC0805GRNPO9BN750
designator C?  Capacitance: 75pF  (hidden comment: *)
Capacitor, Ceramic (MLCC), 75pF, ±2%, 50V, NP0, ±2%, SMD 0805; Manufacturer: YAGEO; Manufacturer Part Number: CC0805GRNPO9BN750; Package Size: 0805; JLCPCB Basic Part: No; JLCPCB Part Number: C520070; Supplier 1: LCSC; Category: Capacitors - MLCC; Supplier Part Number 1: C520070; Tolerance: ±2%; Voltage Rating: 50V; Temperature Coefficient: NP0; RoHS: Yes; ComponentLink1Description: Datasheet; ComponentLink1URL: https://wmsc.lcsc.com/wmsc/upload/file/pdf/v2/lcsc/2009111706_YAGEO-CC0805GRNPO9BN750_C520070.pdf; ComponentLink2Description: JLCPCB Part URL; ComponentLink2URL: https://jlcpcb.com/partdetail/C520070; ComponentLink3Description: LCSC Part URL; ComponentLink3URL: https://lcsc.com/product-detail/Multilayer-Ceramic-Capacitors-MLCC---SMD-SMT_YAGEO-YAGEO-CC0805GRNPO9BN750_C520070.html
footprint CAP-0805 (0805 (2012M) Capacitor)
pins: 1, 2

## CC0805GRNPO9BN820
designator C?  Capacitance: 82pF  (hidden comment: *)
Capacitor, Ceramic (MLCC), 82pF, ±2%, 50V, NP0, ±2%, SMD 0805; Manufacturer: YAGEO; Manufacturer Part Number: CC0805GRNPO9BN820; Package Size: 0805; JLCPCB Basic Part: No; JLCPCB Part Number: C520065; Supplier 1: LCSC; Category: Capacitors - MLCC; Supplier Part Number 1: C520065; Tolerance: ±2%; Voltage Rating: 50V; Temperature Coefficient: NP0; RoHS: Yes; ComponentLink1Description: Datasheet; ComponentLink1URL: https://wmsc.lcsc.com/wmsc/upload/file/pdf/v2/lcsc/2010251434_YAGEO-CC0805GRNPO9BN820_C520065.pdf; ComponentLink2Description: JLCPCB Part URL; ComponentLink2URL: https://jlcpcb.com/partdetail/C520065; ComponentLink3Description: LCSC Part URL; ComponentLink3URL: https://lcsc.com/product-detail/Multilayer-Ceramic-Capacitors-MLCC---SMD-SMT_YAGEO-YAGEO-CC0805GRNPO9BN820_C520065.html
footprint CAP-0805 (0805 (2012M) Capacitor)
pins: 1, 2

## CC0805GRNPO9BN821
designator C?  Capacitance: 820pF  (hidden comment: *)
Capacitor, Ceramic (MLCC), 820pF, ±2%, 50V, NP0, ±2%, SMD 0805; Manufacturer: YAGEO; Manufacturer Part Number: CC0805GRNPO9BN821; Package Size: 0805; JLCPCB Basic Part: No; JLCPCB Part Number: C309484; Supplier 1: LCSC; Category: Capacitors - MLCC; Supplier Part Number 1: C309484; Tolerance: ±2%; Voltage Rating: 50V; Temperature Coefficient: NP0; RoHS: Yes; ComponentLink1Description: Datasheet; ComponentLink1URL: https://wmsc.lcsc.com/wmsc/upload/file/pdf/v2/lcsc/2304140030_YAGEO-CC0805GRNPO9BN821_C309484.pdf; ComponentLink2Description: JLCPCB Part URL; ComponentLink2URL: https://jlcpcb.com/partdetail/C309484; ComponentLink3Description: LCSC Part URL; ComponentLink3URL: https://lcsc.com/product-detail/Multilayer-Ceramic-Capacitors-MLCC---SMD-SMT_YAGEO-YAGEO-CC0805GRNPO9BN821_C309484.html
footprint CAP-0805 (0805 (2012M) Capacitor)
pins: 1, 2

## CC0805GRNPO9BN910
designator C?  Capacitance: 91pF  (hidden comment: *)
Capacitor, Ceramic (MLCC), 91pF, ±2%, 50V, NP0, ±2%, SMD 0805; Manufacturer: YAGEO; Manufacturer Part Number: CC0805GRNPO9BN910; Package Size: 0805; JLCPCB Basic Part: No; JLCPCB Part Number: C520071; Supplier 1: LCSC; Category: Capacitors - MLCC; Supplier Part Number 1: C520071; Tolerance: ±2%; Voltage Rating: 50V; Temperature Coefficient: NP0; RoHS: Yes; ComponentLink1Description: Datasheet; ComponentLink1URL: https://wmsc.lcsc.com/wmsc/upload/file/pdf/v2/lcsc/2007231535_YAGEO-CC0805GRNPO9BN910_C520071.pdf; ComponentLink2Description: JLCPCB Part URL; ComponentLink2URL: https://jlcpcb.com/partdetail/C520071; ComponentLink3Description: LCSC Part URL; ComponentLink3URL: https://lcsc.com/product-detail/Multilayer-Ceramic-Capacitors-MLCC---SMD-SMT_YAGEO-YAGEO-CC0805GRNPO9BN910_C520071.html
footprint CAP-0805 (0805 (2012M) Capacitor)
pins: 1, 2

## CC0805JKNPO0BN222
designator C?  Capacitance: 2.2nF  (hidden comment: *)
Capacitor, Ceramic (MLCC), 2.2nF, ±5%, 100V, NP0, ±5%, SMD 0805; Manufacturer: YAGEO; Manufacturer Part Number: CC0805JKNPO0BN222; Package Size: 0805; JLCPCB Basic Part: No; JLCPCB Part Number: C513663; Supplier 1: LCSC; Category: Capacitors - MLCC; Supplier Part Number 1: C513663; Tolerance: ±5%; Voltage Rating: 100V; Temperature Coefficient: NP0; RoHS: Yes; ComponentLink1Description: Datasheet; ComponentLink1URL: https://wmsc.lcsc.com/wmsc/upload/file/pdf/v2/lcsc/2005142208_YAGEO-CC0805JKNPO0BN222_C513663.pdf; ComponentLink2Description: JLCPCB Part URL; ComponentLink2URL: https://jlcpcb.com/partdetail/C513663; ComponentLink3Description: LCSC Part URL; ComponentLink3URL: https://lcsc.com/product-detail/Multilayer-Ceramic-Capacitors-MLCC---SMD-SMT_YAGEO-YAGEO-CC0805JKNPO0BN222_C513663.html
footprint CAP-0805 (0805 (2012M) Capacitor)
pins: 1, 2

## CC0805JKNPO0BN272
designator C?  Capacitance: 2.7nF  (hidden comment: *)
Capacitor, Ceramic (MLCC), 2.7nF, ±5%, 100V, NP0, ±5%, SMD 0805; Manufacturer: YAGEO; Manufacturer Part Number: CC0805JKNPO0BN272; Package Size: 0805; JLCPCB Basic Part: No; JLCPCB Part Number: C527198; Supplier 1: LCSC; Category: Capacitors - MLCC; Supplier Part Number 1: C527198; Tolerance: ±5%; Voltage Rating: 100V; Temperature Coefficient: NP0; RoHS: Yes; ComponentLink1Description: Datasheet; ComponentLink1URL: https://wmsc.lcsc.com/wmsc/upload/file/pdf/v2/lcsc/2006241834_YAGEO-CC0805JKNPO0BN272_C527198.pdf; ComponentLink2Description: JLCPCB Part URL; ComponentLink2URL: https://jlcpcb.com/partdetail/C527198; ComponentLink3Description: LCSC Part URL; ComponentLink3URL: https://lcsc.com/product-detail/Multilayer-Ceramic-Capacitors-MLCC---SMD-SMT_YAGEO-YAGEO-CC0805JKNPO0BN272_C527198.html
footprint CAP-0805 (0805 (2012M) Capacitor)
pins: 1, 2

## CC0805JKNPO0BN332
designator C?  Capacitance: 3.3nF  (hidden comment: *)
Capacitor, Ceramic (MLCC), 3.3nF, ±5%, 100V, NP0, ±5%, SMD 0805; Manufacturer: YAGEO; Manufacturer Part Number: CC0805JKNPO0BN332; Package Size: 0805; JLCPCB Basic Part: No; JLCPCB Part Number: C527199; Supplier 1: LCSC; Category: Capacitors - MLCC; Supplier Part Number 1: C527199; Tolerance: ±5%; Voltage Rating: 100V; Temperature Coefficient: NP0; RoHS: Yes; ComponentLink1Description: Datasheet; ComponentLink1URL: https://wmsc.lcsc.com/wmsc/upload/file/pdf/v2/lcsc/2006031835_YAGEO-CC0805JKNPO0BN332_C527199.pdf; ComponentLink2Description: JLCPCB Part URL; ComponentLink2URL: https://jlcpcb.com/partdetail/C527199; ComponentLink3Description: LCSC Part URL; ComponentLink3URL: https://lcsc.com/product-detail/Multilayer-Ceramic-Capacitors-MLCC---SMD-SMT_YAGEO-YAGEO-CC0805JKNPO0BN332_C527199.html
footprint CAP-0805 (0805 (2012M) Capacitor)
pins: 1, 2

## CC0805JKNPO0BN472
designator C?  Capacitance: 4.7nF  (hidden comment: *)
Capacitor, Ceramic (MLCC), 4.7nF, ±5%, 100V, NP0, ±5%, SMD 0805; Manufacturer: YAGEO; Manufacturer Part Number: CC0805JKNPO0BN472; Package Size: 0805; JLCPCB Basic Part: No; JLCPCB Part Number: C513576; Supplier 1: LCSC; Category: Capacitors - MLCC; Supplier Part Number 1: C513576; Tolerance: ±5%; Voltage Rating: 100V; Temperature Coefficient: NP0; RoHS: Yes; ComponentLink1Description: Datasheet; ComponentLink1URL: https://wmsc.lcsc.com/wmsc/upload/file/pdf/v2/lcsc/2004231432_YAGEO-CC0805JKNPO0BN472_C513576.pdf; ComponentLink2Description: JLCPCB Part URL; ComponentLink2URL: https://jlcpcb.com/partdetail/C513576; ComponentLink3Description: LCSC Part URL; ComponentLink3URL: https://lcsc.com/product-detail/Multilayer-Ceramic-Capacitors-MLCC---SMD-SMT_YAGEO-YAGEO-CC0805JKNPO0BN472_C513576.html
footprint CAP-0805 (0805 (2012M) Capacitor)
pins: 1, 2
